# Altium footprint library Electronic Devices_LIB.PcbLib: 410 footprints (part 21 of 26)
Each footprint in its own frame and in the unit in brackets; x right, y up, seen from the top. Pads: shape width x height; smd on the part's side, far side on the other; paste and mask are expansions set on the pad; w line width, h text height; cw(c..) or ccw(c..) is an arc to the next point about the centre after c.
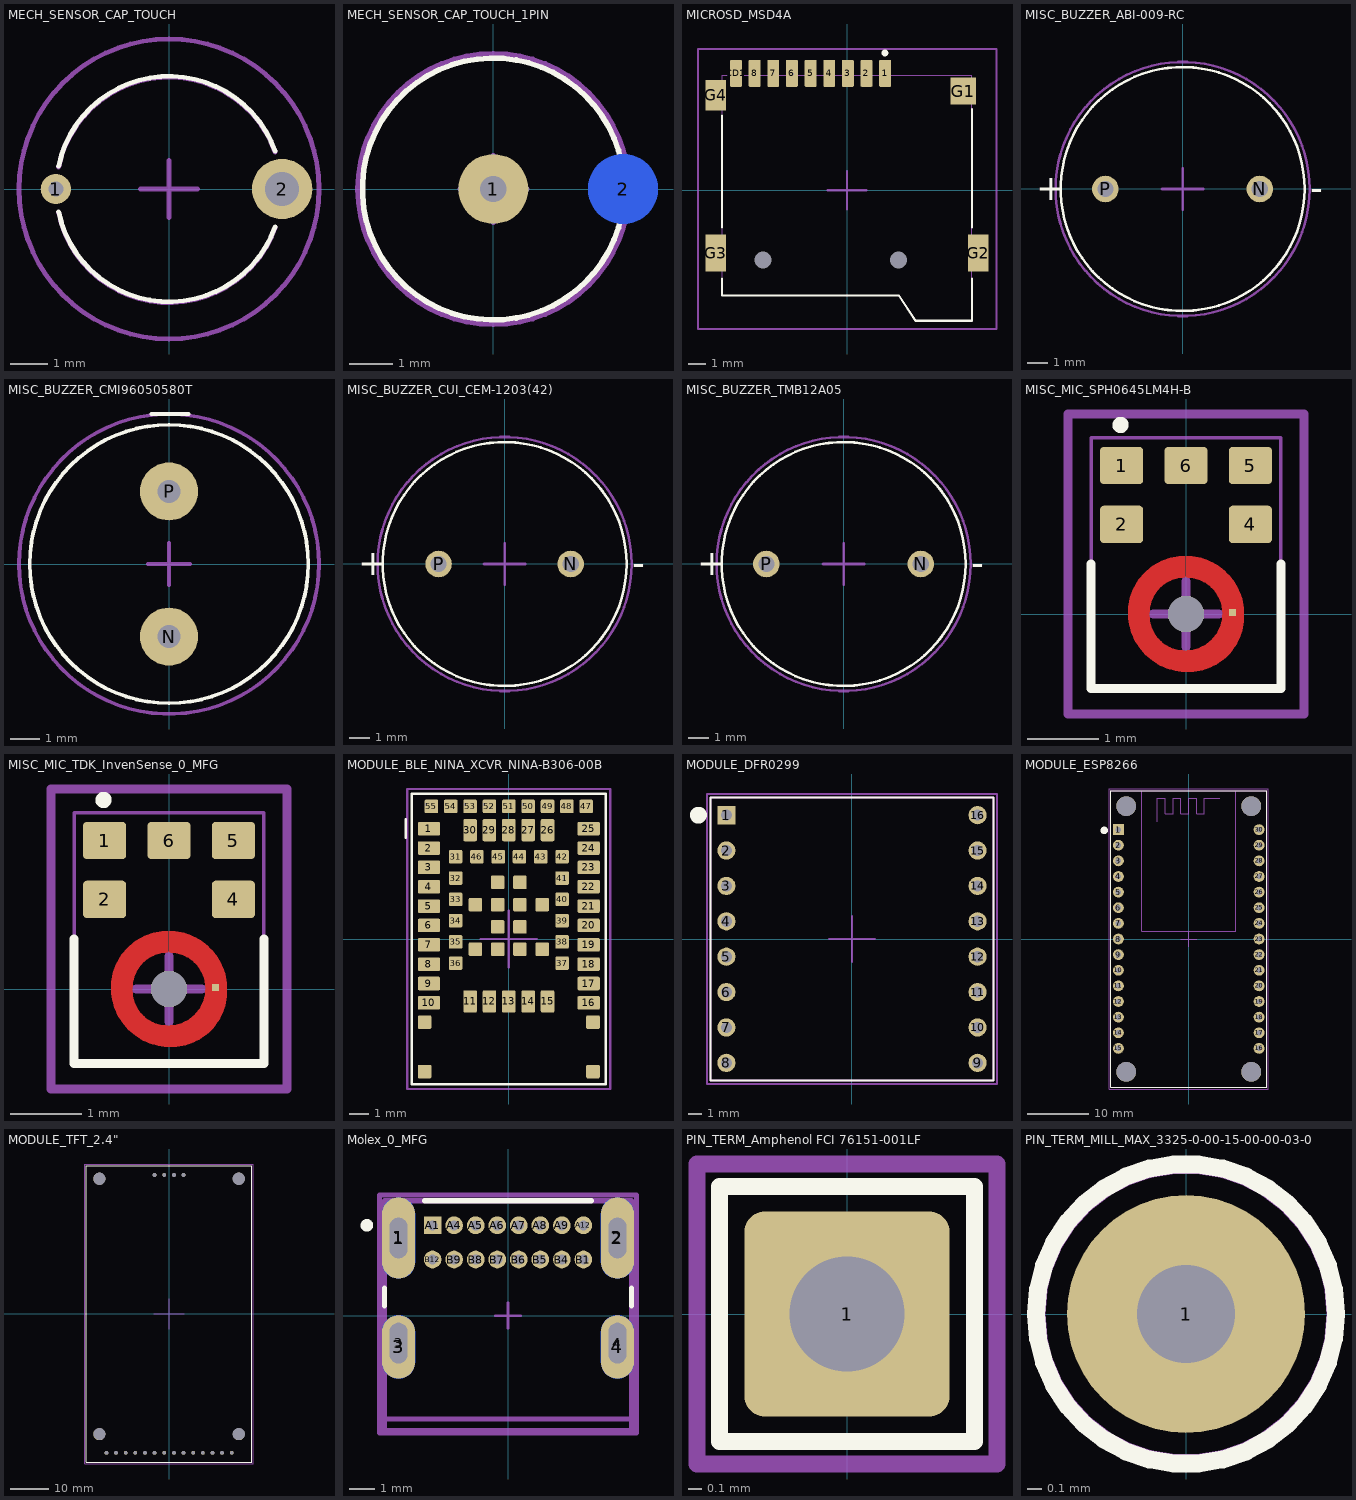
[diagram p20: the footprints below, top view; thin cyan lines are the x and y axes]

## MECH_SENSOR_CAP_TOUCH [mm] "DIA = 6mm ,HEIGHT= 9mm HOLE U = 0.9mm HOLE S = 0.4mm"
height 9
pads (2):
  round 0.8 hole 0.4: 1(-3,0)
  round 1.6 hole 0.9: 2(3,0)
Top Overlay:
  lines w0.127: -2.926,-0.605 ccw(c0,0) 2.817,-0.999 ; -2.926,0.605 cw(c0,0) 2.817,0.999
Top Assembly:
  text ".Designator" at -2.692,-1.304 h0.51
Top Courtyard:
  circle w0.127: c0,0 r3.976
  lines w0.127: -0.762,0 0,0 ; 0,-0.762 0,0 ; 0,0.762 0,0 ; 0.762,0 0,0
Top Component Center:
  lines w0.127: -2.926,-0.631 ccw(c0,-0.025) 2.817,-1.024 ; -2.926,0.58 cw(c0,-0.025) 2.817,0.973

## MECH_SENSOR_CAP_TOUCH_1PIN [mm] "DIA = 6mm ,HEIGHT= 9mm HOLE U = 0.9mm HOLE S = 0.4mm"
height 9
pads (2):
  round 1.6 hole 0.6: 1(0,0)
  round 1.6 smd far side: 2(2.972,0)
Top Overlay:
  circle w0.127: c0,0 r3
Top Assembly:
  text ".Designator" at -2.489,-1.253 h0.51
Top Courtyard:
  circle w0.127: c0,0 r3.1
  lines w0.127: -0.762,0 0,0 ; 0,-0.762 0,0 ; 0,0.762 0,0 ; 0.762,0 0,0

## MICROSD_MSD4A [mm]
pads (15):
  rrect20% 0.7x1.6 smd: 1(2.25,6.9) 2(1.15,6.9) 3(0.05,6.9) 4(-1.05,6.9) 5(-2.15,6.9) 6(-3.25,6.9) 7(-4.35,6.9) 8(-5.45,6.9) CD1(-6.55,6.9)
  rect 1.5x1.6 smd: G1(6.85,5.85)
  rect 1.2x2.2 smd: G2(7.75,-3.7) G3(-7.75,-3.7)
  rect 1.2x1.8 smd: G4(-7.75,5.6)
  round 0.5 hole 1 unplated: MH1(3.05,-4.1) MH2(-4.95,-4.1)
Top Overlay:
  lines w0.127: -7.375,-5.2 -7.375,-6.2 3.05,-6.2 4.05,-7.7 7.375,-7.7 7.375,-5.2 ; -7.375,-2.2 -7.375,4.4 ; 7.375,-2.2 7.375,4.8
  lines w0.3: 2.235,8.053 cw(c2.235,8.103) 2.235,8.153 cw(c2.235,8.103) 2.235,8.053
Top Assembly:
  lines w0.051: -7.375,-6.2 3.05,-6.2 4.05,-7.7 7.375,-7.7 7.375,6.8 3.05,6.8 -7.375,6.8 -7.375,-6.2
  text ".Designator" at -2.438,-0.009 h0.51
Top Courtyard:
  lines w0.127: -1.143,0 0,0 ; 0,-1.143 0,0 ; 0,1.143 0,0 ; 1.143,0 0,0 ; -8.788,-8.179 -8.788,8.331 8.814,8.331 8.814,-8.179 -8.788,-8.179
3D body "MSD-4-A.stp": height 1.9, standoff -0.61, extent -8.083,-7.25 8.033,7.801

## MISC_BUZZER_ABI-009-RC [mm] "0.472\" Dia (12.00mm)"
height 9.5
pads (2):
  round 1.308 hole 0.8: N(3.8,0) P(-3.8,0)
Top Overlay:
  circle w0.127: c0,0 r6
  text "+" at -7.214,-0.559 h1.27
  text "-" at 6.274,-0.584 h1.27
Top Assembly:
  circle w0.051: c0,0 r6
  text ".Designator" at -2.515,-1.025 h0.51
Top Courtyard:
  circle w0.127: c0,0 r6.25
  lines w0.127: -1.016,0 0,0 ; 0,-1.016 0,0 ; 0,1.016 0,0 ; 1.016,0 0,0
3D body "CUI_DEVICES_CEM-1205-IC.step": height 9.01, standoff -4.99, extent -6.025,-5.975 5.964,6.025

## MISC_BUZZER_CMI96050580T [mm] "0.378\" Dia (9.60mm)"
height 5.5
pads (2):
  round 2 hole 0.8: N(0,-2.5) P(0,2.5)
Top Overlay:
  lines w0.127: -0.61,5.167 0.686,5.167 ; -4.8,0 cw(c0,0) 4.8,0 cw(c0,0) -4.8,0
Top Assembly:
  lines w0.051: -4.8,0 cw(c0,0) 4.8,0 cw(c0,0) -4.8,0
  text ".Designator" at -2.54,0.129 h0.51
Top Courtyard:
  circle w0.127: c0,0 r5.169
  lines w0.127: -0.737,0 0,0 ; 0,-0.737 0,0 ; 0,0.737 0,0 ; 0.737,0 0,0
3D body "CMI-9605-0580T.stp": height 5.07, standoff -5.43, extent -4.8,-4.81 4.8,6.765

## MISC_BUZZER_CUI_CEM-1203(42) [mm] "0.472\" Dia (12.00mm)"
height 9
pads (2):
  round 1.308 hole 0.8: N(3.25,0) P(-3.25,0)
Top Overlay:
  circle w0.127: c0,0 r6
  text "+" at -7.214,-0.559 h1.27
  text "-" at 6.274,-0.584 h1.27
Top Assembly:
  circle w0.051: c0,0 r6
  text ".Designator" at -2.515,-1.025 h0.51
Top Courtyard:
  circle w0.127: c0,0 r6.25
  lines w0.127: -1.016,0 0,0 ; 0,-1.016 0,0 ; 0,1.016 0,0 ; 1.016,0 0,0
3D body "step_temp.STEP": height 8.5, standoff -5.5, extent -6.025,-5.955 5.975,6.045

## MISC_BUZZER_TMB12A05 [mm] "0.472\" Dia (12.00mm)"
height 9.5
pads (2):
  round 1.308 hole 0.8: N(3.8,0) P(-3.8,0)
Top Overlay:
  circle w0.127: c0,0 r6
  text "-" at 6.274,-0.584 h1.27
  text "+" at -7.214,-0.559 h1.27
Top Assembly:
  circle w0.051: c0,0 r6
  text ".Designator" at -2.515,-1.025 h0.51
Top Courtyard:
  circle w0.127: c0,0 r6.25
  lines w0.127: -1.016,0 0,0 ; 0,-1.016 0,0 ; 0,1.016 0,0 ; 1.016,0 0,0
3D body "CUI_DEVICES_CEM-1205-IC.step": height 9.01, standoff -4.99, extent -6.025,-5.975 5.964,6.025

## MISC_MIC_SPH0645LM4H-B [mm]
pads (7):
  rrect20% 0.6x0.522 smd: 1(-0.9,2.074) 2(-0.9,1.252) 4(0.9,1.252) 5(0.9,2.074) 6(0,2.074)
  rect 0.1x0.1 smd paste-1 mask+0: 3(0.65,0.02)
  round 0.5 hole 0.5 unplated: ""(0,0)
Top Layer:
  region: 246 vertices and 0 holes, not listed, extent -0.81,-0.81 0.81,0.81
Top Overlay:
  lines w0.127: -1.325,0.7 -1.325,-1.04 1.325,-1.04 1.325,0.7 ; -0.87,2.664 ccw(c-0.914,2.642) -0.864,2.642
Top Paste:
  region: -0.525,0.39 -0.426,0.293 -0.462,0.225 -0.505,0.125 -0.52,0.005 -0.524,0.005 -0.52,-0.005 -0.505,-0.11 -0.51,-0.12 -0.505,-0.12 -0.465,-0.23 -0.43,-0.285 -0.53,-0.385 -0.64,-0.5 -0.705,-0.4 -0.75,-0.31 -0.796,-0.16 -0.81,0 -0.8,0.14 -0.78,0.22 -0.75,0.31 -0.7,0.41 -0.635,0.505
  region: 0.38,-0.53 0.495,-0.645 0.425,-0.69 0.31,-0.75 0.16,-0.796 0,-0.81 -0.14,-0.8 -0.22,-0.78 -0.31,-0.75 -0.405,-0.705 -0.5,-0.64 -0.385,-0.525 -0.288,-0.426 -0.225,-0.462 -0.12,-0.5 0,-0.514 0.12,-0.5 0.23,-0.46 0.28,-0.425
  region: 0.705,0.405 0.75,0.31 0.78,0.235 0.796,0.16 0.81,0.065 0.81,-0.06 0.8,-0.14 0.78,-0.23 0.75,-0.31 0.705,-0.405 0.64,-0.5 0.52,-0.38 0.421,-0.283 0.462,-0.225 0.5,-0.12 0.514,0 0.5,0.12 0.46,0.23 0.425,0.28 0.53,0.385 0.64,0.5
  region: 0.14,0.8 0.23,0.78 0.31,0.75 0.41,0.7 0.5,0.64 0.385,0.525 0.283,0.426 0.225,0.462 0.12,0.5 0,0.514 -0.06,0.51 -0.12,0.5 -0.175,0.485 -0.23,0.46 -0.28,0.435 -0.375,0.53 -0.49,0.645 -0.415,0.7 -0.31,0.75 -0.16,0.796 0,0.81
Top Solder:
  circle w0.912: c0,0 r0.456
Top Assembly:
  lines w0.051: -1.325,-1.04 1.325,-1.04 1.325,2.46 -1.325,2.46 -1.325,-1.04
  text ".Designator" at -2.438,-0.085 h0.51
Top Courtyard:
  lines w0.127: -0.457,0 0,0 ; 0,-0.457 0,0 ; 0,0.457 0,0 ; 0.457,0 0,0 ; -1.651,-1.397 1.651,-1.397 1.651,2.794 -1.651,2.794 -1.651,-1.397
3D body "SPH0645LM4H-B--3DModel-STEP-56544.STEP": height 1.09, standoff 0.01, extent -1.325,-1.013 1.325,2.487

## MISC_MIC_TDK_InvenSense_0_MFG [mm]
pads (7):
  rrect20% 0.6x0.522 smd: 1(-0.9,2.074) 2(-0.9,1.252) 4(0.9,1.252) 5(0.9,2.074) 6(0,2.074)
  rect 0.1x0.1 smd paste-1 mask+0: 3(0.65,0.02)
  round 0.5 hole 0.5 unplated: ""(0,0)
Top Layer:
  region: 246 vertices and 0 holes, not listed, extent -0.81,-0.81 0.81,0.81
Top Overlay:
  lines w0.127: -1.325,0.7 -1.325,-1.04 1.325,-1.04 1.325,0.7 ; -0.87,2.664 ccw(c-0.914,2.642) -0.864,2.642
Top Paste:
  region: 0.14,0.8 0.23,0.78 0.31,0.75 0.41,0.7 0.5,0.64 0.385,0.525 0.283,0.426 0.225,0.462 0.12,0.5 0,0.514 -0.06,0.51 -0.12,0.5 -0.175,0.485 -0.23,0.46 -0.28,0.435 -0.375,0.53 -0.49,0.645 -0.415,0.7 -0.31,0.75 -0.16,0.796 0,0.81
  region: 0.705,0.405 0.75,0.31 0.78,0.235 0.796,0.16 0.81,0.065 0.81,-0.06 0.8,-0.14 0.78,-0.23 0.75,-0.31 0.705,-0.405 0.64,-0.5 0.52,-0.38 0.421,-0.283 0.462,-0.225 0.5,-0.12 0.514,0 0.5,0.12 0.46,0.23 0.425,0.28 0.53,0.385 0.64,0.5
  region: 0.38,-0.53 0.495,-0.645 0.425,-0.69 0.31,-0.75 0.16,-0.796 0,-0.81 -0.14,-0.8 -0.22,-0.78 -0.31,-0.75 -0.405,-0.705 -0.5,-0.64 -0.385,-0.525 -0.288,-0.426 -0.225,-0.462 -0.12,-0.5 0,-0.514 0.12,-0.5 0.23,-0.46 0.28,-0.425
  region: -0.525,0.39 -0.426,0.293 -0.462,0.225 -0.505,0.125 -0.52,0.005 -0.524,0.005 -0.52,-0.005 -0.505,-0.11 -0.51,-0.12 -0.505,-0.12 -0.465,-0.23 -0.43,-0.285 -0.53,-0.385 -0.64,-0.5 -0.705,-0.4 -0.75,-0.31 -0.796,-0.16 -0.81,0 -0.8,0.14 -0.78,0.22 -0.75,0.31 -0.7,0.41 -0.635,0.505
Top Solder:
  circle w0.912: c0,0 r0.456
Top Assembly:
  lines w0.051: -1.325,-1.04 -1.325,2.46 1.325,2.46 1.325,-1.04 -1.325,-1.04
  text ".Designator" at -2.438,-0.085 h0.51
Top Courtyard:
  lines w0.127: -0.457,0 0,0 ; 0,-0.457 0,0 ; 0,0.457 0,0 ; 0.457,0 0,0 ; -1.651,-1.397 -1.651,2.794 1.651,2.794 1.651,-1.397 -1.651,-1.397
3D body "SPH0645LM4H-B--3DModel-STEP-56544.STEP": height 1.09, standoff 0.01, extent -1.325,-1.013 1.325,2.487

## MODULE_BLE_NINA_XCVR_NINA-B306-00B [mm] "NINA B306 00B"
height 2.23
pads (71):
  rrect20% 1.15x0.7 smd: 1(-4.125,5.7) 2(-4.125,4.7) 3(-4.125,3.7) 4(-4.125,2.7) 5(-4.125,1.7) 6(-4.125,0.7) 7(-4.125,-0.3) 8(-4.125,-1.3) 9(-4.125,-2.3) 10(-4.125,-3.3) 16(4.125,-3.3) 17(4.125,-2.3) 18(4.125,-1.3) 19(4.125,-0.3) 20(4.125,0.7) 21(4.125,1.7) 22(4.125,2.7) 23(4.125,3.7) 24(4.125,4.7) 25(4.125,5.7)
  rrect20% 0.7x1.15 smd: 11(-2,-3.225) 12(-1,-3.225) 13(0,-3.225) 14(1,-3.225) 15(2,-3.225) 26(2,5.625) 27(1,5.625) 28(0,5.625) 29(-1,5.625) 30(-2,5.625)
  rrect20% 0.7x0.7 smd: 31(-2.75,4.25) 32(-2.75,3.15) 33(-2.75,2.05) 34(-2.75,0.95) 35(-2.75,-0.15) 36(-2.75,-1.25) 37(2.75,-1.25) 38(2.75,-0.15) 39(2.75,0.95) 40(2.75,2.05) 41(2.75,3.15) 42(2.75,4.25) 43(1.65,4.25) 44(0.55,4.25) 45(-0.55,4.25) 46(-1.65,4.25) 47(4,6.85) 48(3,6.85) 49(2,6.85) 50(1,6.85) 51(0,6.85) 52(-1,6.85) 53(-2,6.85) 54(-3,6.85) 55(-4,6.85) EAGP1(-4.35,-4.3) EAGP2(4.35,-4.3) EAGP3(-4.35,-6.85) EAGP4(4.35,-6.85) EGP1(-0.575,2.925) EGP2(0.575,2.925) EGP3(-1.725,1.775) EGP4(-0.575,1.775) EGP5(0.575,1.775) EGP6(1.725,1.775) EGP7(-0.575,0.625) EGP8(0.575,0.625) EGP9(-1.725,-0.525) EGP10(-0.575,-0.525) EGP11(0.575,-0.525) EGP12(1.725,-0.525)
Top Overlay:
  lines w0.127: -5.334,5.232 -5.334,6.198 ; -5.014,-7.514 5.014,-7.514 5.014,7.514 -5.014,7.514 -5.014,-7.514
Top Assembly:
  lines w0.051: -5,-7.5 -5,7.5 5,7.5 5,-7.5 -5,-7.5
  text ".Designator" at -2.21,0.093 h0.51
Top Courtyard:
  lines w0.127: -1.448,0 0,0 ; 0,-1.448 0,0 ; 0,1.448 0,0 ; 1.448,0 0,0 ; -5.25,-7.75 -5.25,7.75 5.25,7.75 5.25,-7.75 -5.25,-7.75
3D body "step_temp.STEP": height 2.63, standoff 0, extent -5,-7.5 5,7.5

## MODULE_DFR0299 [mm]
pads (16):
  rect 1.308x1.308 hole 0.8: 1(-9.017,8.89)
  round 1.308 hole 0.8: 2(-9.017,6.35) 3(-9.017,3.81) 4(-9.017,1.27) 5(-9.017,-1.27) 6(-9.017,-3.81) 7(-9.017,-6.35) 8(-9.017,-8.89) 9(9.017,-8.89) 10(9.017,-6.35) 11(9.017,-3.81) 12(9.017,-1.27) 13(9.017,1.27) 14(9.017,3.81) 15(9.017,6.35) 16(9.017,8.89)
Top Overlay:
  circle w1: c-11.027,8.89 r0.1
  lines w0.127: -10.16,-10.16 10.16,-10.16 10.16,10.16 -10.16,10.16 -10.16,-10.16
Top Assembly:
  lines w0.127: -10.16,-10.16 -10.16,10.16 10.16,10.16 10.16,-10.16 -10.16,-10.16
  text ".Designator" at -2.489,-0.212 h0.51
Top Courtyard:
  lines w0.127: -1.676,0 0,0 ; 0,-1.676 0,0 ; 0,1.676 0,0 ; 1.676,0 0,0 ; -10.41,-10.41 -10.41,10.41 10.41,10.41 10.41,-10.41 -10.41,-10.41
3D body "DFR0299--3DModel-STEP-56544.STEP": height 6.25, standoff -5.5, extent -10.16,-10.135 10.16,10.185

## MODULE_ESP8266 [mil]
pads (34):
  rect 69x69 / inner round 69 / far side rect 69x69 hole 35: 1(-450,700)
  round 69 hole 35: 2(-450,600) 3(-450,500) 4(-450,400) 5(-450,300) 6(-450,200) 7(-450,100) 8(-450,0) 9(-450,-100) 10(-450,-200) 11(-450,-300) 12(-450,-400) 13(-450,-500) 14(-450,-600) 15(-450,-700) 16(450,-700) 17(450,-600) 18(450,-500) 19(450,-400) 20(450,-300) 21(450,-200) 22(450,-100) 23(450,0) 24(450,100) 25(450,200) 26(450,300) 27(450,400) 28(450,500) 29(450,600) 30(450,700)
  round 125.98 hole 125.98 unplated: ""(-400,-850) ""(-400,850) ""(400,-850) ""(400,850)
Top Overlay:
  circle w39.37: c-541,695 r3.94
  lines w5: -500,-950 500,-950 500,950 -500,950 -500,-950
Top Assembly:
  lines w5: -200,750 -200,900 -150,900 -150,800 -100,800 -100,900 -50,900 -50,800 0,800 0,900 50,900 50,800 100,800 100,900 200,900 ; -300,950 300,950 ; -300,950 -500,950 -500,-950 500,-950 500,950 300,950 ; -300,950 -300,50 300,50 300,950
  text ".Designator" at -94,-8.34 h20
Top Courtyard:
  lines w5: -51,0 0,0 ; 0,-51 0,0 ; 0,51 0,0 ; 51,0 0,0 ; -509.84,-959.84 -509.84,959.84 509.84,959.84 509.84,-959.84 -509.84,-959.84
3D body "ZC563900--3DModel-STEP-269445.STEP": height 283.46, standoff -228.35, extent -499,-967.47 501,953

## MODULE_TFT_2.4" [mm]
pads (22):
  round 1 hole 1: 1(-16.51,-36.59) 2(-13.97,-36.59) 3(-11.43,-36.59) 4(-8.89,-36.59) 5(-6.35,-36.59) 6(-3.81,-36.59) 7(-1.27,-36.59) 8(1.27,-36.59) 9(3.81,-36.59) 10(6.35,-36.59) 11(8.89,-36.59) 12(11.43,-36.59) 13(13.97,-36.59) 14(16.51,-36.59) 15(-3.81,36.59) 16(-1.27,36.59) 17(1.27,36.59) 18(3.81,36.59)
  round 3.2 hole 3.2: ""(-18.36,-31.669) ""(-18.36,35.59) ""(18.36,35.59) ""(18.36,-31.67)
Top Overlay:
  lines w0.127: -21.772,-39.026 -21.772,38.974 21.728,38.974 21.728,-39.026 -21.772,-39.026
Top Courtyard:
  lines w0.127: -4,0 0,0 ; 0,-4 0,0 ; 0,4 0,0 ; 4,0 0,0 ; -22.272,-39.526 -22.272,39.474 22.228,39.474 22.228,-39.526 -22.272,-39.526
3D body "TFT LCD 2.4 inch ILI9341.step": height 10, standoff -4.5, extent -21.332,-38.626 21.389,38.554

## Molex_0_MFG [mm]
pads (28):
  rrect100% 0.7x1.6 hole 1.6 slot 0.7 at 0 deg paste-2539.97 mask+0: 1(-4.32,3.065) 2(4.32,3.065) 3(-4.32,-1.085) 4(4.32,-1.085)
  rrect100% 1.3x3.2 smd paste-1000 mask+0: 1(-4.32,3.065) 2(4.32,3.065)
  rrect100% 1.3x3.2 smd far side paste-1000 mask+0: 1(-4.32,3.065) 2(4.32,3.065)
  rrect100% 1.3x2.5 smd paste-1000 mask+0: 3(-4.32,-1.235) 4(4.32,-1.235)
  rrect100% 1.3x2.5 smd far side paste-1000 mask+0: 3(-4.32,-1.235) 4(4.32,-1.235)
  rect 0.7x0.7 hole 0.4 paste-2539.97 mask+0: A1(-2.975,3.565)
  round 0.7 hole 0.4 paste-2539.97 mask+0: A4(-2.125,3.565) A5(-1.275,3.565) A6(-0.425,3.565) A7(0.425,3.565) A8(1.275,3.565) A9(2.125,3.565) A12(2.975,3.565) B1(2.975,2.215) B4(2.125,2.215) B5(1.275,2.215) B6(0.425,2.215) B7(-0.425,2.215) B8(-1.275,2.215) B9(-2.125,2.215) B12(-2.975,2.215)
Top Overlay:
  circle w0.25: c-5.57,3.565 r0.125
  lines w0.2: -4.87,0.39 -4.87,1.09 ; -3.295,4.535 3.295,4.535 ; 4.87,0.39 4.87,1.09
Bottom Component Center (Mech10):
  lines w0.2: -5.07,-4.635 -5.07,4.765 5.07,4.765 5.07,-4.635 -5.07,-4.635
  text ".Designator" at 0,0.065 h1
Bottom Component Outline:
  lines w0.2: -5.07,-4.085 5.07,-4.085 ; -4.87,-4.535 -4.87,4.535 4.87,4.535 4.87,-4.535 -4.87,-4.535
Mechanical 15:
  lines w0.1: -0.5,0 0.5,0 ; 0,-0.5 0,0.5
  lines w0.2: -5.07,-4.635 -5.07,4.765 5.07,4.765 5.07,-4.635 -5.07,-4.635
3D body "Conn_Molex_2137160001_eec.STEP": height 0.25, standoff 0, extent -5.07,-4.635 5.07,4.765

## PIN_TERM_Amphenol FCI 76151-001LF [mm] "Single Post TermTerminal Connector Through Hole Gold 0.025\" (0.64mm) Square"
height 8.6
pads (1):
  rrect20% 1.53x1.53 hole 0.86 square: 1(0,0)
Top Overlay:
  lines w0.127: -0.95,-0.95 -0.95,0.95 0.95,0.95 0.95,-0.95 -0.95,-0.95
Top Assembly:
  text ".Designator" at -2.413,-0.161 h0.51
Top Courtyard:
  lines w0.127: -0.457,0 0,0 ; 0,-0.457 0,0 ; 0,0.457 0,0 ; 0.457,0 0,0 ; -1.118,-1.118 -1.118,1.118 1.118,1.118 1.118,-1.118 -1.118,-1.118

## PIN_TERM_MILL_MAX_3325-0-00-15-00-00-03-0 [mm] "Single Post Terminal Connector Through Hole Gold 0.025\" (0.64mm) Dia"
height 6.35
pads (1):
  round 1.7 hole 0.7: 1(0,0)
Top Overlay:
  circle w0.127: c0,0 r1.072
Top Assembly:
  text ".Designator" at -2.515,-0.161 h0.51
Top Courtyard:
  circle w0.127: c0,0 r1.068
  lines w0.127: -0.457,0 0,0 ; 0,-0.457 0,0 ; 0,0.457 0,0 ; 0.457,0 0,0
3D body "mill-max-3325-0-00-80-00-00-03-0.STEP": height 4, standoff -2.35, extent -0.318,-0.318 0.318,0.318